# Altium footprint library myPcbLib.PcbLib: 987 footprints (part 59 of 62)
Each footprint in its own frame and in the unit in brackets; x right, y up, seen from the top. Pads: shape width x height; smd on the part's side, far side on the other; paste and mask are expansions set on the pad; w line width, h text height; cw(c..) or ccw(c..) is an arc to the next point about the centre after c.
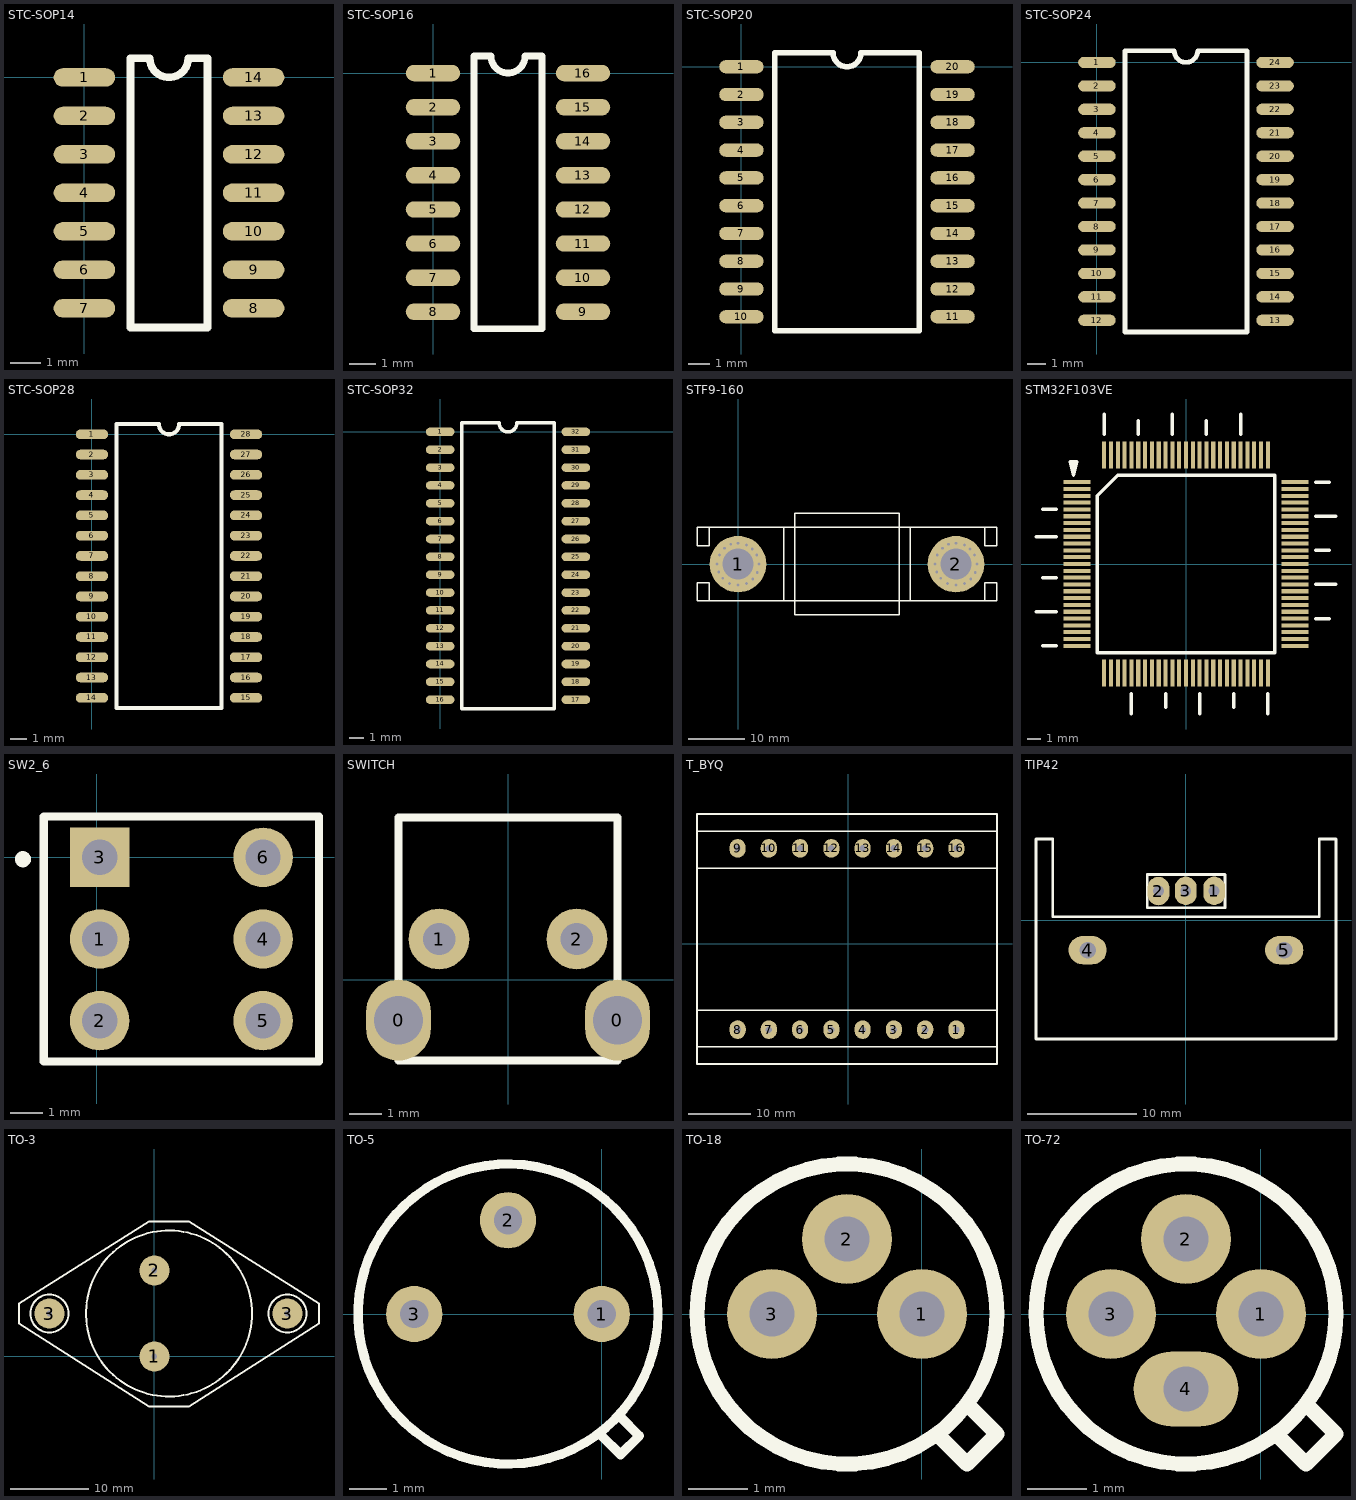
[diagram p58: the footprints below, top view; thin cyan lines are the x and y axes]

## STC-SOP14 [mil]
pads (14):
  oval 80x24 smd: 1(0,0) 2(0,-50) 3(0,-100) 4(0,-150) 5(0,-200) 6(0,-250) 7(0,-300) 8(220,-300) 9(220,-250) 10(220,-200) 11(220,-150) 12(220,-100) 13(220,-50) 14(220,0)
Top Overlay:
  lines w10: 60,-325 60,25 85,25 ccw(c110,25) 135,25 160,25 160,-325 60,-325

## STC-SOP16 [mil]
pads (16):
  oval 80x24 smd: 1(0,0) 2(0,-50) 3(0,-100) 4(0,-150) 5(0,-200) 6(0,-250) 7(0,-300) 8(0,-350) 9(220,-350) 10(220,-300) 11(220,-250) 12(220,-200) 13(220,-150) 14(220,-100) 15(220,-50) 16(220,0)
Top Overlay:
  lines w10: 60,-375 160,-375 160,25 135,25 cw(c110,25) 85,25 60,25 60,-375

## STC-SOP20 [mil]
pads (20):
  oval 80x24 smd: 1(0,0) 2(0,-50) 3(0,-100) 4(0,-150) 5(0,-200) 6(0,-250) 7(0,-300) 8(0,-350) 9(0,-400) 10(0,-450) 11(380,-450) 12(380,-400) 13(380,-350) 14(380,-300) 15(380,-250) 16(380,-200) 17(380,-150) 18(380,-100) 19(380,-50) 20(380,0)
Top Overlay:
  lines w10: 60,-475 320,-475 320,25 215,25 cw(c190,25) 165,25 60,25 60,-475

## STC-SOP24 [mil]
pads (24):
  oval 80x24 smd: 1(0,0) 2(0,-50) 3(0,-100) 4(0,-150) 5(0,-200) 6(0,-250) 7(0,-300) 8(0,-350) 9(0,-400) 10(0,-450) 11(0,-500) 12(0,-550) 13(380,-550) 14(380,-500) 15(380,-450) 16(380,-400) 17(380,-350) 18(380,-300) 19(380,-250) 20(380,-200) 21(380,-150) 22(380,-100) 23(380,-50) 24(380,0)
Top Overlay:
  lines w10: 60,-575 320,-575 320,25 215,25 cw(c190,25) 165,25 60,25 60,-575

## STC-SOP28 [mil]
pads (28):
  oval 80x24 smd: 1(0,0) 2(0,-50) 3(0,-100) 4(0,-150) 5(0,-200) 6(0,-250) 7(0,-300) 8(0,-350) 9(0,-400) 10(0,-450) 11(0,-500) 12(0,-550) 13(0,-600) 14(0,-650) 15(380,-650) 16(380,-600) 17(380,-550) 18(380,-500) 19(380,-450) 20(380,-400) 21(380,-350) 22(380,-300) 23(380,-250) 24(380,-200) 25(380,-150) 26(380,-100) 27(380,-50) 28(380,0)
Top Overlay:
  lines w10: 60,-675 320,-675 320,25 215,25 cw(c190,25) 165,25 60,25 60,-675

## STC-SOP32 [mil]
pads (32):
  oval 80x24 smd: 1(0,0) 2(0,-50) 3(0,-100) 4(0,-150) 5(0,-200) 6(0,-250) 7(0,-300) 8(0,-350) 9(0,-400) 10(0,-450) 11(0,-500) 12(0,-550) 13(0,-600) 14(0,-650) 15(0,-700) 16(0,-750) 17(380,-750) 18(380,-700) 19(380,-650) 20(380,-600) 21(380,-550) 22(380,-500) 23(380,-450) 24(380,-400) 25(380,-350) 26(380,-300) 27(380,-250) 28(380,-200) 29(380,-150) 30(380,-100) 31(380,-50) 32(380,0)
Top Overlay:
  lines w10: 60,-775 320,-775 320,25 215,25 cw(c190,25) 165,25 60,25 60,-775

## STF9-160 [mm] "上海电器陶瓷厂"
height 18
pads (2):
  round 10 hole 5.5 unplated: 1(0,0) 2(38.5,0)
via 0,3.7 diameter 0.5 hole 0.5
via 0,-3.7 diameter 0.5 hole 0.5
via -3.7,0 diameter 0.5 hole 0.5
via 3.7,0 diameter 0.5 hole 0.5
via 2.5,2.7 diameter 0.5 hole 0.5
via -2.7,-2.5 diameter 0.5 hole 0.5
via 2.6,-2.6 diameter 0.5 hole 0.5
via -2.4,2.8 diameter 0.5 hole 0.5
via 1.5,3.4 diameter 0.5 hole 0.5
via 3.3,1.6 diameter 0.5 hole 0.5
via 3.4,-1.5 diameter 0.5 hole 0.5
via 1.5,-3.4 diameter 0.5 hole 0.5
via -1.5,-3.4 diameter 0.5 hole 0.5
via -3.4,-1.4 diameter 0.5 hole 0.5
via -3.3,1.6 diameter 0.5 hole 0.5
via -1.3,3.5 diameter 0.5 hole 0.5
via 37.2,3.5 diameter 0.5 hole 0.5
via 35.2,1.6 diameter 0.5 hole 0.5
via 35.1,-1.4 diameter 0.5 hole 0.5
via 37,-3.4 diameter 0.5 hole 0.5
via 40,-3.4 diameter 0.5 hole 0.5
via 41.9,-1.5 diameter 0.5 hole 0.5
via 41.8,1.6 diameter 0.5 hole 0.5
via 40,3.4 diameter 0.5 hole 0.5
via 36.1,2.8 diameter 0.5 hole 0.5
via 41.1,-2.6 diameter 0.5 hole 0.5
via 35.8,-2.5 diameter 0.5 hole 0.5
via 41,2.7 diameter 0.5 hole 0.5
via 42.2,0 diameter 0.5 hole 0.5
via 34.8,0 diameter 0.5 hole 0.5
via 38.5,-3.7 diameter 0.5 hole 0.5
via 38.5,3.7 diameter 0.5 hole 0.5
Top Overlay:
  lines w0.254: -5.1,-6.5 -5.1,-3.25 ; -5.1,6.5 -5.1,3.225 ; 8.075,-6.5 8.075,6.5 ; 30.45,-6.5 30.45,6.5 ; 43.6,-6.5 43.6,-3.25 45.75,-3.25 45.75,-3.275 45.75,-6.5 -7.25,-6.5 ; 43.6,6.5 43.6,3.225 45.75,3.225 45.75,6.5 -7.25,6.5 ; -7.25,-6.5 -7.25,-3.275 ; -7.25,-6.5 -7.25,-3.275 ; -7.25,-3.275 -7.25,-3.25 ; -7.25,-3.275 -7.25,-3.25 ; -7.25,-3.25 -5.1,-3.25 ; -7.25,-3.25 -5.1,-3.25 ; -7.25,3.225 -5.1,3.225 ; -7.25,3.225 -7.25,6.5 ; -7.25,3.225 -5.1,3.225 ; -7.25,3.225 -7.25,6.5 ; 9.975,-8.975 28.5,-8.975 28.5,9.025 9.975,9.025 9.975,-8.975

## STM32F103VE [mm]
pads (100):
  rect 2x0.3 smd: 1(-8,6) 2(-8,5.5) 3(-8,5) 4(-8,4.5) 5(-8,4) 6(-8,3.5) 7(-8,3) 8(-8,2.5) 9(-8,2) 10(-8,1.5) 11(-8,1) 12(-8,0.5) 13(-8,0) 14(-8,-0.5) 15(-8,-1) 16(-8,-1.5) 17(-8,-2) 18(-8,-2.5) 19(-8,-3) 20(-8,-3.5) 21(-8,-4) 22(-8,-4.5) 23(-8,-5) 24(-8,-5.5) 25(-8,-6) 51(8,-6) 52(8,-5.5) 53(8,-5) 54(8,-4.5) 55(8,-4) 56(8,-3.5) 57(8,-3) 58(8,-2.5) 59(8,-2) 60(8,-1.5) 61(8,-1) 62(8,-0.5) 63(8,0) 64(8,0.5) 65(8,1) 66(8,1.5) 67(8,2) 68(8,2.5) 69(8,3) 70(8,3.5) 71(8,4) 72(8,4.5) 73(8,5) 74(8,5.5) 75(8,6)
  rect 0.3x2 smd: 26(-6,-8) 27(-5.5,-8) 28(-5,-8) 29(-4.5,-8) 30(-4,-8) 31(-3.5,-8) 32(-3,-8) 33(-2.5,-8) 34(-2,-8) 35(-1.5,-8) 36(-1,-8) 37(-0.5,-8) 38(0,-8) 39(0.5,-8) 40(1,-8) 41(1.5,-8) 42(2,-8) 43(2.5,-8) 44(3,-8) 45(3.5,-8) 46(4,-8) 47(4.5,-8) 48(5,-8) 49(5.5,-8) 50(6,-8) 76(6,8) 77(5.5,8) 78(5,8) 79(4.5,8) 80(4,8) 81(3.5,8) 82(3,8) 83(2.5,8) 84(2,8) 85(1.5,8) 86(1,8) 87(0.5,8) 88(0,8) 89(-0.5,8) 90(-1,8) 91(-1.5,8) 92(-2,8) 93(-2.5,8) 94(-3,8) 95(-3.5,8) 96(-4,8) 97(-4.5,8) 98(-5,8) 99(-5.5,8) 100(-6,8)
Top Overlay:
  region: -8.5,7.5 -8.25,6.5 -8,7.5
  lines w0.254: -11,-3.5 -9.5,-3.5 ; -11,2 -9.5,2 ; -10.5,-6 -9.5,-6 ; -10.5,-1 -9.5,-1 ; -10.5,4 -9.5,4 ; -6,9.5 -6,11 ; -4,-11 -4,-9.5 ; -3.5,9.5 -3.5,10.5 ; -1.5,-10.5 -1.5,-9.5 ; -1,9.5 -1,11 ; 1,-11 1,-9.5 ; 1.5,9.5 1.5,10.5 ; 3.5,-10.5 3.5,-9.5 ; 4,9.5 4,11 ; 6,-11 6,-9.5 ; 9.5,-4 10.5,-4 ; 9.5,-1.5 11,-1.5 ; 9.5,1 10.5,1 ; 9.5,3.5 11,3.5 ; 9.5,6 10.5,6 ; -8.5,7.5 -8,7.5 -8.25,6.5 -8.5,7.5 ; -6.5,-6.5 6.5,-6.5 6.5,6.5 -5,6.5 -6.5,5 -6.5,-6.5
3D body "SW3dPS-TQFP100-1.STEP": height 1.61, standoff -0.01, extent -8.001,-7.999 7.999,8.001

## SW2_6 [mm]
pads (6):
  round 1.85 hole 1.1: 1(0.1,-2.54) 2(0.1,-5.08) 4(5.18,-2.54) 5(5.18,-5.08) 6(5.18,0)
  rect 1.85x1.85 hole 1.1: 3(0.1,0)
Top Overlay:
  circle w0.25: c-2.286,-0.059 r0.125
  lines w0.254: -1.64,-6.35 -1.64,1.27 6.92,1.27 6.92,-6.35 -1.64,-6.35

## SWITCH [mil]
height 393.7
pads (4):
  oval 80x100 hole 60: 0(-135,-50) 0(135,-50)
  round 75 hole 40: 1(-85,50) 2(85,50)
Top Overlay:
  lines w10: -135,-100 -135,200 135,200 135,-100 -135,-100

## T_BYQ [mm]
pads (16):
  oval 2.6x3 hole 1: 1(17.295,-13.739) 2(12.295,-13.739) 3(7.295,-13.739) 4(2.295,-13.739) 5(-2.705,-13.739) 6(-7.705,-13.739) 7(-12.705,-13.739) 8(-17.705,-13.739) 9(-17.705,15.261) 10(-12.705,15.261) 11(-7.705,15.261) 12(-2.705,15.261) 13(2.295,15.261) 14(7.295,15.261) 15(12.295,15.261) 16(17.295,15.261)
Top Overlay:
  lines w0.254: -24.205,12.064 23.668,12.064 ; -24.078,-16.511 23.795,-16.511 ; -24.078,-10.669 23.795,-10.669 ; -24.078,18.033 23.795,18.033 ; -24.205,-19.239 -24.205,20.761 23.795,20.761 23.795,-19.239 -24.205,-19.239

## TIP42 [mm]
pads (5):
  oval 2x2.6 hole 1: 1(2.59,2.71) 2(-2.51,2.686) 3(-0.01,2.71)
  oval 3.5x2.6 hole 1.5: 4(-8.99,-2.71) 5(8.99,-2.71)
Top Overlay:
  lines w0.254: -12.182,0.846 -12.182,7.45 -13.706,7.45 -13.706,-10.838 -12.69,-10.838 12.71,-10.838 13.218,-10.838 13.726,-10.838 13.726,7.45 12.71,7.45 12.202,7.45 12.202,0.846 ; -12.182,1.354 -12.182,0.338 -11.674,0.338 11.694,0.338 12.202,0.338 12.202,1.354 ; -3.526,1.162 -3.526,4.21 3.586,4.21 3.586,2.686 3.586,1.162 -3.526,1.162

## TO-3 [mil]
pads (4):
  round 150 hole 28: 1(0,0) 2(0,430) 3(-525,215) 3(665,215)
Top Overlay:
  circle w10: c73,215 r415
  circle w10: c665,215 r95
  circle w10: c-525,215 r95
  lines w10: -677,165 -27,-250 173,-250 823,165 823,265 173,675 -27,675 -677,265 -677,165

## TO-5 [mil]
pads (3):
  round 60 hole 30: 1(0,0) 2(-100,100) 3(-200,0)
Top Overlay:
  circle w10: c-100,0 r160
  lines w10: 0,-130 20,-150 40,-130 20,-110

## TO-18 [mil]
pads (3):
  round 60 hole 30: 1(0,0) 2(-50,50) 3(-100,0)
Top Overlay:
  circle w10: c-50,0 r100
  lines w10: 10,-80 30,-100 50,-80 30,-60

## TO-72 [mil]
pads (4):
  round 60 hole 30: 1(0,0) 2(-50,50) 3(-100,0)
  oval 70x50 hole 30: 4(-50,-50)
Top Overlay:
  circle w10: c-50,0 r100
  lines w10: 10,-80 30,-100 50,-80 30,-60